# Altium schematic symbol library jlcpcb_2025_04_inductors_extended_0402.schlib: 1396 symbols (part 1 of 8) (continued)
## EBLS1005-2R2K
designator L?  Inductance: 2.2uH
Inductor, 2.2uH, ±10%, 1.7Ω, 10mA, SMD 0402; Manufacturer: HYHONGYEX; Manufacturer Part Number: EBLS1005-2R2K; Self-Resonant Frequency: 28MHz; Q Factor: 20@10MHz; Package Size: 0402; JLCPCB Basic Part: No; JLCPCB Part Number: C963788; Supplier 1: LCSC; Category: Inductors; Supplier Part Number 1: C963788; Tolerance: ±10%; Rated Current: 10mA; DC Resistance: 1.7Ω; RoHS: Yes; ComponentLink1Description: Datasheet; ComponentLink1URL: https://wmsc.lcsc.com/wmsc/upload/file/pdf/v2/lcsc/2205060945_HYHONGYEX-EBLS1005-2R2K_C963788.pdf; ComponentLink2Description: JLCPCB Part URL; ComponentLink2URL: https://jlcpcb.com/partdetail/C963788; ComponentLink3Description: LCSC Part URL; ComponentLink3URL: https://lcsc.com/product-detail/Inductors-SMD_HYHONGYEX-HYHONGYEX-EBLS1005-2R2K_C963788.html
footprint IND-0402 (0402 (1005M) Inductor)
pins: 1, 2

## FCI1005F-1R5K
designator L?  Inductance: 1.5uH
Inductor, 1.5uH, ±10%, 1.45Ω, 15mA, SMD 0402; Manufacturer: TAI-TECH; Manufacturer Part Number: FCI1005F-1R5K; Package Size: 0402; JLCPCB Basic Part: No; JLCPCB Part Number: C356917; Supplier 1: LCSC; Category: Inductors; Supplier Part Number 1: C356917; Tolerance: ±10%; Rated Current: 15mA; DC Resistance: 1.45Ω; RoHS: Yes; ComponentLink1Description: Datasheet; ComponentLink1URL: https://wmsc.lcsc.com/wmsc/upload/file/pdf/v2/lcsc/2009171137_TAI-TECH-FCI1005F-1R5K_C356917.pdf; ComponentLink2Description: JLCPCB Part URL; ComponentLink2URL: https://jlcpcb.com/partdetail/C356917; ComponentLink3Description: LCSC Part URL; ComponentLink3URL: https://lcsc.com/product-detail/Inductors-SMD_TAI-TECH-TAI-TECH-FCI1005F-1R5K_C356917.html
footprint IND-0402 (0402 (1005M) Inductor)
pins: 1, 2

## FCI1005F-2R2K
designator L?  Inductance: 2.2uH
Inductor, 2.2uH, ±10%, 1.7Ω, 10mA, SMD 0402; Manufacturer: TAI-TECH; Manufacturer Part Number: FCI1005F-2R2K; Package Size: 0402; JLCPCB Basic Part: No; JLCPCB Part Number: C154999; Supplier 1: LCSC; Category: Inductors; Supplier Part Number 1: C154999; Tolerance: ±10%; Rated Current: 10mA; DC Resistance: 1.7Ω; RoHS: Yes; ComponentLink1Description: Datasheet; ComponentLink1URL: https://wmsc.lcsc.com/wmsc/upload/file/pdf/v2/lcsc/2009171305_TAI-TECH-FCI1005F-2R2K_C154999.pdf; ComponentLink2Description: JLCPCB Part URL; ComponentLink2URL: https://jlcpcb.com/partdetail/C154999; ComponentLink3Description: LCSC Part URL; ComponentLink3URL: https://lcsc.com/product-detail/Inductors-SMD_TAI-TECH-TAI-TECH-FCI1005F-2R2K_C154999.html
footprint IND-0402 (0402 (1005M) Inductor)
pins: 1, 2

## FHW0402UC1N2KST
designator L?  Inductance: 1.2nH
Inductor, 1.2nH, ±10%, 135mΩ, 640mA, SMD 0402; Manufacturer: FH(Guangdong Fenghua Advanced Tech); Manufacturer Part Number: FHW0402UC1N2KST; Self-Resonant Frequency: 10GHz; Q Factor: 8@250MHz; Package Size: 0402; JLCPCB Basic Part: No; JLCPCB Part Number: C317662; Supplier 1: LCSC; Category: Inductors; Supplier Part Number 1: C317662; Tolerance: ±10%; Rated Current: 640mA; DC Resistance: 135mΩ; RoHS: Yes; ComponentLink1Description: Datasheet; ComponentLink1URL: https://wmsc.lcsc.com/wmsc/upload/file/pdf/v2/lcsc/2302231208_FH--Guangdong-Fenghua-Advanced-Tech-FHW0402UC1N2KST_C317662.pdf; ComponentLink2Description: JLCPCB Part URL; ComponentLink2URL: https://jlcpcb.com/partdetail/C317662; ComponentLink3Description: LCSC Part URL; ComponentLink3URL: https://lcsc.com/product-detail/Inductors-SMD_FH-Guangdong-Fenghua-Advanced-Tech-FH-Guangdong-Fenghua-Advanced-Tech-FHW0402UC1N2KST_C317662.html
footprint IND-0402 (0402 (1005M) Inductor)
pins: 1, 2

## FHW0402UC1N8KST
designator L?  Inductance: 1.8nH
Inductor, 1.8nH, ±10%, 70mΩ, 1.04A, SMD 0402; Manufacturer: FH(Guangdong Fenghua Advanced Tech); Manufacturer Part Number: FHW0402UC1N8KST; Self-Resonant Frequency: 6GHz; Q Factor: 16@250MHz; Package Size: 0402; JLCPCB Basic Part: No; JLCPCB Part Number: C317663; Supplier 1: LCSC; Category: Inductors; Supplier Part Number 1: C317663; Tolerance: ±10%; Rated Current: 1.04A; DC Resistance: 70mΩ; RoHS: Yes; ComponentLink1Description: Datasheet; ComponentLink1URL: https://wmsc.lcsc.com/wmsc/upload/file/pdf/v2/lcsc/2302231208_FH--Guangdong-Fenghua-Advanced-Tech-FHW0402UC1N8KST_C317663.pdf; ComponentLink2Description: JLCPCB Part URL; ComponentLink2URL: https://jlcpcb.com/partdetail/C317663; ComponentLink3Description: LCSC Part URL; ComponentLink3URL: https://lcsc.com/product-detail/Inductors-SMD_FH-Guangdong-Fenghua-Advanced-Tech-FH-Guangdong-Fenghua-Advanced-Tech-FHW0402UC1N8KST_C317663.html
footprint IND-0402 (0402 (1005M) Inductor)
pins: 1, 2

## FHW0402UC1N9KST
designator L?  Inductance: 1.9nH
Inductor, 1.9nH, ±10%, 70mΩ, 1.04A, SMD 0402; Manufacturer: FH(Guangdong Fenghua Advanced Tech); Manufacturer Part Number: FHW0402UC1N9KST; Self-Resonant Frequency: 6GHz; Q Factor: 16@250MHz; Package Size: 0402; JLCPCB Basic Part: No; JLCPCB Part Number: C317664; Supplier 1: LCSC; Category: Inductors; Supplier Part Number 1: C317664; Tolerance: ±10%; Rated Current: 1.04A; DC Resistance: 70mΩ; RoHS: Yes; ComponentLink1Description: Datasheet; ComponentLink1URL: https://wmsc.lcsc.com/wmsc/upload/file/pdf/v2/lcsc/2302231208_FH--Guangdong-Fenghua-Advanced-Tech-FHW0402UC1N9KST_C317664.pdf; ComponentLink2Description: JLCPCB Part URL; ComponentLink2URL: https://jlcpcb.com/partdetail/C317664; ComponentLink3Description: LCSC Part URL; ComponentLink3URL: https://lcsc.com/product-detail/Inductors-SMD_FH-Guangdong-Fenghua-Advanced-Tech-FH-Guangdong-Fenghua-Advanced-Tech-FHW0402UC1N9KST_C317664.html
footprint IND-0402 (0402 (1005M) Inductor)
pins: 1, 2

## FHW0402UC2N0KST
designator L?  Inductance: 2nH
Inductor, 2nH, ±10%, 70mΩ, 1.04A, SMD 0402; Manufacturer: FH(Guangdong Fenghua Advanced Tech); Manufacturer Part Number: FHW0402UC2N0KST; Self-Resonant Frequency: 6GHz; Q Factor: 18@250MHz; Package Size: 0402; JLCPCB Basic Part: No; JLCPCB Part Number: C317665; Supplier 1: LCSC; Category: Inductors; Supplier Part Number 1: C317665; Tolerance: ±10%; Rated Current: 1.04A; DC Resistance: 70mΩ; RoHS: Yes; ComponentLink1Description: Datasheet; ComponentLink1URL: https://wmsc.lcsc.com/wmsc/upload/file/pdf/v2/lcsc/2302231208_FH--Guangdong-Fenghua-Advanced-Tech-FHW0402UC2N0KST_C317665.pdf; ComponentLink2Description: JLCPCB Part URL; ComponentLink2URL: https://jlcpcb.com/partdetail/C317665; ComponentLink3Description: LCSC Part URL; ComponentLink3URL: https://lcsc.com/product-detail/Inductors-SMD_FH-Guangdong-Fenghua-Advanced-Tech-FH-Guangdong-Fenghua-Advanced-Tech-FHW0402UC2N0KST_C317665.html
footprint IND-0402 (0402 (1005M) Inductor)
pins: 1, 2

## FHW0402UC2N2KST
designator L?  Inductance: 2.2nH
Inductor, 2.2nH, ±10%, 70mΩ, 960mA, SMD 0402; Manufacturer: FH(Guangdong Fenghua Advanced Tech); Manufacturer Part Number: FHW0402UC2N2KST; Self-Resonant Frequency: 6GHz; Q Factor: 18@250MHz; Package Size: 0402; JLCPCB Basic Part: No; JLCPCB Part Number: C317666; Supplier 1: LCSC; Category: Inductors; Supplier Part Number 1: C317666; Tolerance: ±10%; Rated Current: 960mA; DC Resistance: 70mΩ; RoHS: Yes; ComponentLink1Description: Datasheet; ComponentLink1URL: https://wmsc.lcsc.com/wmsc/upload/file/pdf/v2/lcsc/2302231208_FH--Guangdong-Fenghua-Advanced-Tech-FHW0402UC2N2KST_C317666.pdf; ComponentLink2Description: JLCPCB Part URL; ComponentLink2URL: https://jlcpcb.com/partdetail/C317666; ComponentLink3Description: LCSC Part URL; ComponentLink3URL: https://lcsc.com/product-detail/Inductors-SMD_FH-Guangdong-Fenghua-Advanced-Tech-FH-Guangdong-Fenghua-Advanced-Tech-FHW0402UC2N2KST_C317666.html
footprint IND-0402 (0402 (1005M) Inductor)
pins: 1, 2

## FHW0402UC2N5KST
designator L?  Inductance: 2.5nH
Inductor, 2.5nH, ±10%, 120mΩ, 640mA, SMD 0402; Manufacturer: FH(Guangdong Fenghua Advanced Tech); Manufacturer Part Number: FHW0402UC2N5KST; Self-Resonant Frequency: 6GHz; Q Factor: 15@250MHz; Package Size: 0402; JLCPCB Basic Part: No; JLCPCB Part Number: C317668; Supplier 1: LCSC; Category: Inductors; Supplier Part Number 1: C317668; Tolerance: ±10%; Rated Current: 640mA; DC Resistance: 120mΩ; RoHS: Yes; ComponentLink1Description: Datasheet; ComponentLink1URL: https://wmsc.lcsc.com/wmsc/upload/file/pdf/v2/lcsc/2302231208_FH--Guangdong-Fenghua-Advanced-Tech-FHW0402UC2N5KST_C317668.pdf; ComponentLink2Description: JLCPCB Part URL; ComponentLink2URL: https://jlcpcb.com/partdetail/C317668; ComponentLink3Description: LCSC Part URL; ComponentLink3URL: https://lcsc.com/product-detail/Inductors-SMD_FH-Guangdong-Fenghua-Advanced-Tech-FH-Guangdong-Fenghua-Advanced-Tech-FHW0402UC2N5KST_C317668.html
footprint IND-0402 (0402 (1005M) Inductor)
pins: 1, 2

## FHW0402UC2N7KST
designator L?  Inductance: 2.7nH
Inductor, 2.7nH, ±10%, 120mΩ, 640mA, SMD 0402; Manufacturer: FH(Guangdong Fenghua Advanced Tech); Manufacturer Part Number: FHW0402UC2N7KST; Self-Resonant Frequency: 6GHz; Q Factor: 15@250MHz; Package Size: 0402; JLCPCB Basic Part: No; JLCPCB Part Number: C317935; Supplier 1: LCSC; Category: Inductors; Supplier Part Number 1: C317935; Tolerance: ±10%; Rated Current: 640mA; DC Resistance: 120mΩ; RoHS: Yes; ComponentLink1Description: Datasheet; ComponentLink1URL: https://wmsc.lcsc.com/wmsc/upload/file/pdf/v2/lcsc/2302231208_FH--Guangdong-Fenghua-Advanced-Tech-FHW0402UC2N7KST_C317935.pdf; ComponentLink2Description: JLCPCB Part URL; ComponentLink2URL: https://jlcpcb.com/partdetail/C317935; ComponentLink3Description: LCSC Part URL; ComponentLink3URL: https://lcsc.com/product-detail/Inductors-SMD_FH-Guangdong-Fenghua-Advanced-Tech-FH-Guangdong-Fenghua-Advanced-Tech-FHW0402UC2N7KST_C317935.html
footprint IND-0402 (0402 (1005M) Inductor)
pins: 1, 2

## FHW0402UC2N9KST
designator L?  Inductance: 2.9nH
Inductor, 2.9nH, ±10%, 300mΩ, 400mA, SMD 0402; Manufacturer: FH(Guangdong Fenghua Advanced Tech); Manufacturer Part Number: FHW0402UC2N9KST; Self-Resonant Frequency: 6GHz; Q Factor: 8@250MHz; Package Size: 0402; JLCPCB Basic Part: No; JLCPCB Part Number: C317936; Supplier 1: LCSC; Category: Inductors; Supplier Part Number 1: C317936; Tolerance: ±10%; Rated Current: 400mA; DC Resistance: 300mΩ; RoHS: Yes; ComponentLink1Description: Datasheet; ComponentLink1URL: https://wmsc.lcsc.com/wmsc/upload/file/pdf/v2/lcsc/2302231208_FH--Guangdong-Fenghua-Advanced-Tech-FHW0402UC2N9KST_C317936.pdf; ComponentLink2Description: JLCPCB Part URL; ComponentLink2URL: https://jlcpcb.com/partdetail/C317936; ComponentLink3Description: LCSC Part URL; ComponentLink3URL: https://lcsc.com/product-detail/Inductors-SMD_FH-Guangdong-Fenghua-Advanced-Tech-FH-Guangdong-Fenghua-Advanced-Tech-FHW0402UC2N9KST_C317936.html
footprint IND-0402 (0402 (1005M) Inductor)
pins: 1, 2

## FHW0402UC3N3JST
designator L?  Inductance: 3.3nH
Inductor, 3.3nH, ±5%, 66mΩ, 840mA, SMD 0402; Manufacturer: FH(Guangdong Fenghua Advanced Tech); Manufacturer Part Number: FHW0402UC3N3JST; Self-Resonant Frequency: 6GHz; Q Factor: 20@250MHz; Package Size: 0402; JLCPCB Basic Part: No; JLCPCB Part Number: C317937; Supplier 1: LCSC; Category: Inductors; Supplier Part Number 1: C317937; Tolerance: ±5%; Rated Current: 840mA; DC Resistance: 66mΩ; RoHS: Yes; ComponentLink1Description: Datasheet; ComponentLink1URL: https://wmsc.lcsc.com/wmsc/upload/file/pdf/v2/lcsc/2302231208_FH--Guangdong-Fenghua-Advanced-Tech-FHW0402UC3N3JST_C317937.pdf; ComponentLink2Description: JLCPCB Part URL; ComponentLink2URL: https://jlcpcb.com/partdetail/C317937; ComponentLink3Description: LCSC Part URL; ComponentLink3URL: https://lcsc.com/product-detail/Inductors-SMD_FH-Guangdong-Fenghua-Advanced-Tech-FH-Guangdong-Fenghua-Advanced-Tech-FHW0402UC3N3JST_C317937.html
footprint IND-0402 (0402 (1005M) Inductor)
pins: 1, 2

## FHW0402UC3N9JST
designator L?  Inductance: 3.9nH
Inductor, 3.9nH, ±5%, 66mΩ, 840mA, SMD 0402; Manufacturer: FH(Guangdong Fenghua Advanced Tech); Manufacturer Part Number: FHW0402UC3N9JST; Self-Resonant Frequency: 6GHz; Q Factor: 20@250MHz; Package Size: 0402; JLCPCB Basic Part: No; JLCPCB Part Number: C317939; Supplier 1: LCSC; Category: Inductors; Supplier Part Number 1: C317939; Tolerance: ±5%; Rated Current: 840mA; DC Resistance: 66mΩ; RoHS: Yes; ComponentLink1Description: Datasheet; ComponentLink1URL: https://wmsc.lcsc.com/wmsc/upload/file/pdf/v2/lcsc/2302231208_FH--Guangdong-Fenghua-Advanced-Tech-FHW0402UC3N9JST_C317939.pdf; ComponentLink2Description: JLCPCB Part URL; ComponentLink2URL: https://jlcpcb.com/partdetail/C317939; ComponentLink3Description: LCSC Part URL; ComponentLink3URL: https://lcsc.com/product-detail/Inductors-SMD_FH-Guangdong-Fenghua-Advanced-Tech-FH-Guangdong-Fenghua-Advanced-Tech-FHW0402UC3N9JST_C317939.html
footprint IND-0402 (0402 (1005M) Inductor)
pins: 1, 2

## FHW0402UC4N3JST
designator L?  Inductance: 4.3nH
Inductor, 4.3nH, ±5%, 91mΩ, 700mA, SMD 0402; Manufacturer: FH(Guangdong Fenghua Advanced Tech); Manufacturer Part Number: FHW0402UC4N3JST; Self-Resonant Frequency: 6GHz; Q Factor: 20@250MHz; Package Size: 0402; JLCPCB Basic Part: No; JLCPCB Part Number: C317940; Supplier 1: LCSC; Category: Inductors; Supplier Part Number 1: C317940; Tolerance: ±5%; Rated Current: 700mA; DC Resistance: 91mΩ; RoHS: Yes; ComponentLink1Description: Datasheet; ComponentLink1URL: https://wmsc.lcsc.com/wmsc/upload/file/pdf/v2/lcsc/2302231208_FH--Guangdong-Fenghua-Advanced-Tech-FHW0402UC4N3JST_C317940.pdf; ComponentLink2Description: JLCPCB Part URL; ComponentLink2URL: https://jlcpcb.com/partdetail/C317940; ComponentLink3Description: LCSC Part URL; ComponentLink3URL: https://lcsc.com/product-detail/Inductors-SMD_FH-Guangdong-Fenghua-Advanced-Tech-FH-Guangdong-Fenghua-Advanced-Tech-FHW0402UC4N3JST_C317940.html
footprint IND-0402 (0402 (1005M) Inductor)
pins: 1, 2

## FHW0402UC4N7JST
designator L?  Inductance: 4.7nH
Inductor, 4.7nH, ±5%, 200mΩ, 640mA, SMD 0402; Manufacturer: FH(Guangdong Fenghua Advanced Tech); Manufacturer Part Number: FHW0402UC4N7JST; Self-Resonant Frequency: 4.5GHz; Q Factor: 18@250MHz; Package Size: 0402; JLCPCB Basic Part: No; JLCPCB Part Number: C317941; Supplier 1: LCSC; Category: Inductors; Supplier Part Number 1: C317941; Tolerance: ±5%; Rated Current: 640mA; DC Resistance: 200mΩ; RoHS: Yes; ComponentLink1Description: Datasheet; ComponentLink1URL: https://wmsc.lcsc.com/wmsc/upload/file/pdf/v2/lcsc/2302231208_FH--Guangdong-Fenghua-Advanced-Tech-FHW0402UC4N7JST_C317941.pdf; ComponentLink2Description: JLCPCB Part URL; ComponentLink2URL: https://jlcpcb.com/partdetail/C317941; ComponentLink3Description: LCSC Part URL; ComponentLink3URL: https://lcsc.com/product-detail/Inductors-SMD_FH-Guangdong-Fenghua-Advanced-Tech-FH-Guangdong-Fenghua-Advanced-Tech-FHW0402UC4N7JST_C317941.html
footprint IND-0402 (0402 (1005M) Inductor)
pins: 1, 2

## FHW0402UC5N1JST
designator L?  Inductance: 5.1nH
Inductor, 5.1nH, ±5%, 83mΩ, 800mA, SMD 0402; Manufacturer: FH(Guangdong Fenghua Advanced Tech); Manufacturer Part Number: FHW0402UC5N1JST; Self-Resonant Frequency: 4.8GHz; Q Factor: 18@250MHz; Package Size: 0402; JLCPCB Basic Part: No; JLCPCB Part Number: C317942; Supplier 1: LCSC; Category: Inductors; Supplier Part Number 1: C317942; Tolerance: ±5%; Rated Current: 800mA; DC Resistance: 83mΩ; RoHS: Yes; ComponentLink1Description: Datasheet; ComponentLink1URL: https://wmsc.lcsc.com/wmsc/upload/file/pdf/v2/lcsc/2302231208_FH--Guangdong-Fenghua-Advanced-Tech-FHW0402UC5N1JST_C317942.pdf; ComponentLink2Description: JLCPCB Part URL; ComponentLink2URL: https://jlcpcb.com/partdetail/C317942; ComponentLink3Description: LCSC Part URL; ComponentLink3URL: https://lcsc.com/product-detail/Inductors-SMD_FH-Guangdong-Fenghua-Advanced-Tech-FH-Guangdong-Fenghua-Advanced-Tech-FHW0402UC5N1JST_C317942.html
footprint IND-0402 (0402 (1005M) Inductor)
pins: 1, 2

## FHW0402UC5N6JST
designator L?  Inductance: 5.6nH
Inductor, 5.6nH, ±5%, 83mΩ, 760mA, SMD 0402; Manufacturer: FH(Guangdong Fenghua Advanced Tech); Manufacturer Part Number: FHW0402UC5N6JST; Self-Resonant Frequency: 4.8GHz; Q Factor: 20@250MHz; Package Size: 0402; JLCPCB Basic Part: No; JLCPCB Part Number: C317943; Supplier 1: LCSC; Category: Inductors; Supplier Part Number 1: C317943; Tolerance: ±5%; Rated Current: 760mA; DC Resistance: 83mΩ; RoHS: Yes; ComponentLink1Description: Datasheet; ComponentLink1URL: https://wmsc.lcsc.com/wmsc/upload/file/pdf/v2/lcsc/2302231208_FH--Guangdong-Fenghua-Advanced-Tech-FHW0402UC5N6JST_C317943.pdf; ComponentLink2Description: JLCPCB Part URL; ComponentLink2URL: https://jlcpcb.com/partdetail/C317943; ComponentLink3Description: LCSC Part URL; ComponentLink3URL: https://lcsc.com/product-detail/Inductors-SMD_FH-Guangdong-Fenghua-Advanced-Tech-FH-Guangdong-Fenghua-Advanced-Tech-FHW0402UC5N6JST_C317943.html
footprint IND-0402 (0402 (1005M) Inductor)
pins: 1, 2

## FHW0402UC6N2JST
designator L?  Inductance: 6.2nH
Inductor, 6.2nH, ±5%, 83mΩ, 760mA, SMD 0402; Manufacturer: FH(Guangdong Fenghua Advanced Tech); Manufacturer Part Number: FHW0402UC6N2JST; Self-Resonant Frequency: 4.8GHz; Q Factor: 23@250MHz; Package Size: 0402; JLCPCB Basic Part: No; JLCPCB Part Number: C304265; Supplier 1: LCSC; Category: Inductors; Supplier Part Number 1: C304265; Tolerance: ±5%; Rated Current: 760mA; DC Resistance: 83mΩ; RoHS: Yes; ComponentLink1Description: Datasheet; ComponentLink1URL: https://wmsc.lcsc.com/wmsc/upload/file/pdf/v2/lcsc/2302231030_FH--Guangdong-Fenghua-Advanced-Tech-FHW0402UC6N2JST_C304265.pdf; ComponentLink2Description: JLCPCB Part URL; ComponentLink2URL: https://jlcpcb.com/partdetail/C304265; ComponentLink3Description: LCSC Part URL; ComponentLink3URL: https://lcsc.com/product-detail/Inductors-SMD_FH-Guangdong-Fenghua-Advanced-Tech-FH-Guangdong-Fenghua-Advanced-Tech-FHW0402UC6N2JST_C304265.html
footprint IND-0402 (0402 (1005M) Inductor)
pins: 1, 2

## FHW0402UC6N8JST
designator L?  Inductance: 6.8nH
Inductor, 6.8nH, ±5%, 260mΩ, 680mA, SMD 0402; Manufacturer: FH(Guangdong Fenghua Advanced Tech); Manufacturer Part Number: FHW0402UC6N8JST; Self-Resonant Frequency: 4.8GHz; Q Factor: 23@250MHz; Package Size: 0402; JLCPCB Basic Part: No; JLCPCB Part Number: C317944; Supplier 1: LCSC; Category: Inductors; Supplier Part Number 1: C317944; Tolerance: ±5%; Rated Current: 680mA; DC Resistance: 260mΩ; RoHS: Yes; ComponentLink1Description: Datasheet; ComponentLink1URL: https://wmsc.lcsc.com/wmsc/upload/file/pdf/v2/lcsc/2302231208_FH--Guangdong-Fenghua-Advanced-Tech-FHW0402UC6N8JST_C317944.pdf; ComponentLink2Description: JLCPCB Part URL; ComponentLink2URL: https://jlcpcb.com/partdetail/C317944; ComponentLink3Description: LCSC Part URL; ComponentLink3URL: https://lcsc.com/product-detail/Inductors-SMD_FH-Guangdong-Fenghua-Advanced-Tech-FH-Guangdong-Fenghua-Advanced-Tech-FHW0402UC6N8JST_C317944.html
footprint IND-0402 (0402 (1005M) Inductor)
pins: 1, 2

## FHW0402UC7N5JST
designator L?  Inductance: 7.5nH
Inductor, 7.5nH, ±5%, 100mΩ, 680mA, SMD 0402; Manufacturer: FH(Guangdong Fenghua Advanced Tech); Manufacturer Part Number: FHW0402UC7N5JST; Self-Resonant Frequency: 4.8GHz; Q Factor: 23@250MHz; Package Size: 0402; JLCPCB Basic Part: No; JLCPCB Part Number: C317945; Supplier 1: LCSC; Category: Inductors; Supplier Part Number 1: C317945; Tolerance: ±5%; Rated Current: 680mA; DC Resistance: 100mΩ; RoHS: Yes; ComponentLink1Description: Datasheet; ComponentLink1URL: https://wmsc.lcsc.com/wmsc/upload/file/pdf/v2/lcsc/2302231208_FH--Guangdong-Fenghua-Advanced-Tech-FHW0402UC7N5JST_C317945.pdf; ComponentLink2Description: JLCPCB Part URL; ComponentLink2URL: https://jlcpcb.com/partdetail/C317945; ComponentLink3Description: LCSC Part URL; ComponentLink3URL: https://lcsc.com/product-detail/Inductors-SMD_FH-Guangdong-Fenghua-Advanced-Tech-FH-Guangdong-Fenghua-Advanced-Tech-FHW0402UC7N5JST_C317945.html
footprint IND-0402 (0402 (1005M) Inductor)
pins: 1, 2

## FHW0402UC8N2JST
designator L?  Inductance: 8.2nH
Inductor, 8.2nH, ±5%, 100mΩ, 680mA, SMD 0402; Manufacturer: FH(Guangdong Fenghua Advanced Tech); Manufacturer Part Number: FHW0402UC8N2JST; Self-Resonant Frequency: 4.4GHz; Q Factor: 25@250MHz; Package Size: 0402; JLCPCB Basic Part: No; JLCPCB Part Number: C317946; Supplier 1: LCSC; Category: Inductors; Supplier Part Number 1: C317946; Tolerance: ±5%; Rated Current: 680mA; DC Resistance: 100mΩ; RoHS: Yes; ComponentLink1Description: Datasheet; ComponentLink1URL: https://wmsc.lcsc.com/wmsc/upload/file/pdf/v2/lcsc/2302231208_FH--Guangdong-Fenghua-Advanced-Tech-FHW0402UC8N2JST_C317946.pdf; ComponentLink2Description: JLCPCB Part URL; ComponentLink2URL: https://jlcpcb.com/partdetail/C317946; ComponentLink3Description: LCSC Part URL; ComponentLink3URL: https://lcsc.com/product-detail/Inductors-SMD_FH-Guangdong-Fenghua-Advanced-Tech-FH-Guangdong-Fenghua-Advanced-Tech-FHW0402UC8N2JST_C317946.html
footprint IND-0402 (0402 (1005M) Inductor)
pins: 1, 2

## FHW0402UC8N7JST
designator L?  Inductance: 8.7nH
Inductor, 8.7nH, ±5%, 200mΩ, 480mA, SMD 0402; Manufacturer: FH(Guangdong Fenghua Advanced Tech); Manufacturer Part Number: FHW0402UC8N7JST; Self-Resonant Frequency: 4.1GHz; Q Factor: 25@250MHz; Package Size: 0402; JLCPCB Basic Part: No; JLCPCB Part Number: C317947; Supplier 1: LCSC; Category: Inductors; Supplier Part Number 1: C317947; Tolerance: ±5%; Rated Current: 480mA; DC Resistance: 200mΩ; RoHS: Yes; ComponentLink1Description: Datasheet; ComponentLink1URL: https://wmsc.lcsc.com/wmsc/upload/file/pdf/v2/lcsc/2302231208_FH--Guangdong-Fenghua-Advanced-Tech-FHW0402UC8N7JST_C317947.pdf; ComponentLink2Description: JLCPCB Part URL; ComponentLink2URL: https://jlcpcb.com/partdetail/C317947; ComponentLink3Description: LCSC Part URL; ComponentLink3URL: https://lcsc.com/product-detail/Inductors-SMD_FH-Guangdong-Fenghua-Advanced-Tech-FH-Guangdong-Fenghua-Advanced-Tech-FHW0402UC8N7JST_C317947.html
footprint IND-0402 (0402 (1005M) Inductor)
pins: 1, 2

## FHW0402UC9N0JST
designator L?  Inductance: 9nH
Inductor, 9nH, ±5%, 100mΩ, 680mA, SMD 0402; Manufacturer: FH(Guangdong Fenghua Advanced Tech); Manufacturer Part Number: FHW0402UC9N0JST; Self-Resonant Frequency: 4.16GHz; Q Factor: 25@250MHz; Package Size: 0402; JLCPCB Basic Part: No; JLCPCB Part Number: C317948; Supplier 1: LCSC; Category: Inductors; Supplier Part Number 1: C317948; Tolerance: ±5%; Rated Current: 680mA; DC Resistance: 100mΩ; RoHS: Yes; ComponentLink1Description: Datasheet; ComponentLink1URL: https://wmsc.lcsc.com/wmsc/upload/file/pdf/v2/lcsc/2302231208_FH--Guangdong-Fenghua-Advanced-Tech-FHW0402UC9N0JST_C317948.pdf; ComponentLink2Description: JLCPCB Part URL; ComponentLink2URL: https://jlcpcb.com/partdetail/C317948; ComponentLink3Description: LCSC Part URL; ComponentLink3URL: https://lcsc.com/product-detail/Inductors-SMD_FH-Guangdong-Fenghua-Advanced-Tech-FH-Guangdong-Fenghua-Advanced-Tech-FHW0402UC9N0JST_C317948.html
footprint IND-0402 (0402 (1005M) Inductor)
pins: 1, 2

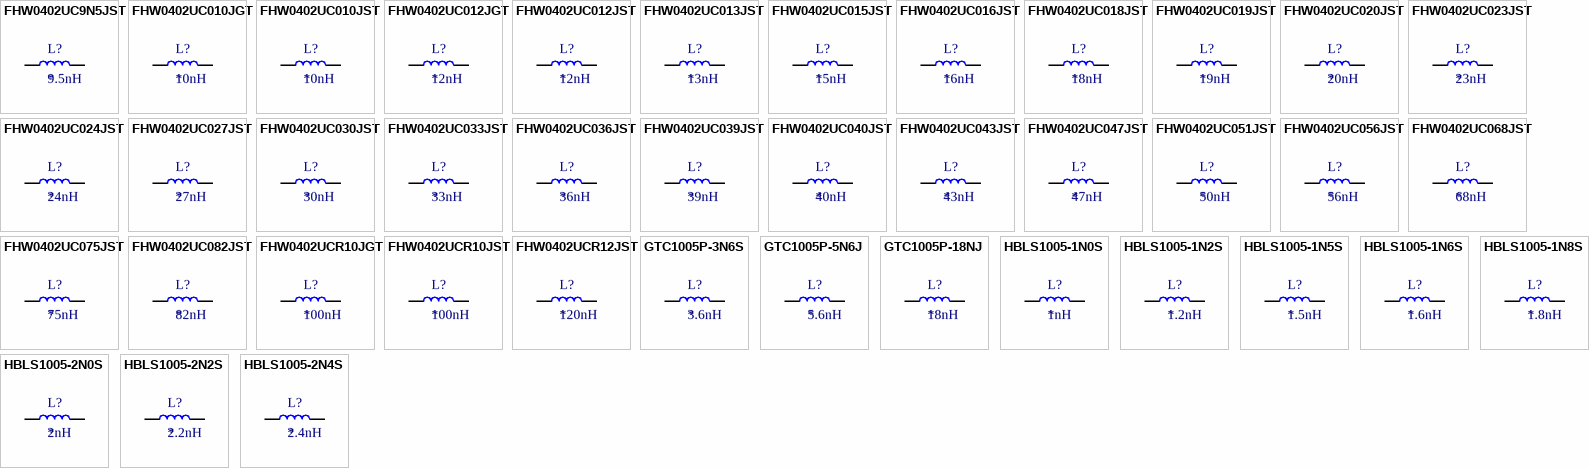
[diagram p4: symbols FHW0402UC9N5JST to HBLS1005-2N4S]

## FHW0402UC9N5JST
designator L?  Inductance: 9.5nH
Inductor, 9.5nH, ±5%, 200mΩ, 480mA, SMD 0402; Manufacturer: FH(Guangdong Fenghua Advanced Tech); Manufacturer Part Number: FHW0402UC9N5JST; Self-Resonant Frequency: 4GHz; Q Factor: 25@250MHz; Package Size: 0402; JLCPCB Basic Part: No; JLCPCB Part Number: C317949; Supplier 1: LCSC; Category: Inductors; Supplier Part Number 1: C317949; Tolerance: ±5%; Rated Current: 480mA; DC Resistance: 200mΩ; RoHS: Yes; ComponentLink1Description: Datasheet; ComponentLink1URL: https://wmsc.lcsc.com/wmsc/upload/file/pdf/v2/lcsc/2302231208_FH--Guangdong-Fenghua-Advanced-Tech-FHW0402UC9N5JST_C317949.pdf; ComponentLink2Description: JLCPCB Part URL; ComponentLink2URL: https://jlcpcb.com/partdetail/C317949; ComponentLink3Description: LCSC Part URL; ComponentLink3URL: https://lcsc.com/product-detail/Inductors-SMD_FH-Guangdong-Fenghua-Advanced-Tech-FH-Guangdong-Fenghua-Advanced-Tech-FHW0402UC9N5JST_C317949.html
footprint IND-0402 (0402 (1005M) Inductor)
pins: 1, 2

## FHW0402UC010JGT
designator L?  Inductance: 10nH
Inductor, 10nH, ±5%, 200mΩ, 480mA, SMD 0402; Manufacturer: FH(Guangdong Fenghua Advanced Tech); Manufacturer Part Number: FHW0402UC010JGT; Self-Resonant Frequency: 3.9GHz; Q Factor: 25@250MHz; Package Size: 0402; JLCPCB Basic Part: No; JLCPCB Part Number: C316442; Supplier 1: LCSC; Category: Inductors; Supplier Part Number 1: C316442; Tolerance: ±5%; Rated Current: 480mA; DC Resistance: 200mΩ; RoHS: Yes; ComponentLink1Description: Datasheet; ComponentLink1URL: https://wmsc.lcsc.com/wmsc/upload/file/pdf/v2/lcsc/2110111630_FH--Guangdong-Fenghua-Advanced-Tech-FHW0402UC010JGT_C316442.pdf; ComponentLink2Description: JLCPCB Part URL; ComponentLink2URL: https://jlcpcb.com/partdetail/C316442; ComponentLink3Description: LCSC Part URL; ComponentLink3URL: https://lcsc.com/product-detail/Inductors-SMD_FH-Guangdong-Fenghua-Advanced-Tech-FH-Guangdong-Fenghua-Advanced-Tech-FHW0402UC010JGT_C316442.html
footprint IND-0402 (0402 (1005M) Inductor)
pins: 1, 2

## FHW0402UC010JST
designator L?  Inductance: 10nH
Inductor, 10nH, ±5%, 200mΩ, 480mA, SMD 0402; Manufacturer: FH(Guangdong Fenghua Advanced Tech); Manufacturer Part Number: FHW0402UC010JST; Self-Resonant Frequency: 3.9GHz; Q Factor: 25@250MHz; Package Size: 0402; JLCPCB Basic Part: No; JLCPCB Part Number: C317950; Supplier 1: LCSC; Category: Inductors; Supplier Part Number 1: C317950; Tolerance: ±5%; Rated Current: 480mA; DC Resistance: 200mΩ; RoHS: Yes; ComponentLink1Description: Datasheet; ComponentLink1URL: https://wmsc.lcsc.com/wmsc/upload/file/pdf/v2/lcsc/2302231208_FH--Guangdong-Fenghua-Advanced-Tech-FHW0402UC010JST_C317950.pdf; ComponentLink2Description: JLCPCB Part URL; ComponentLink2URL: https://jlcpcb.com/partdetail/C317950; ComponentLink3Description: LCSC Part URL; ComponentLink3URL: https://lcsc.com/product-detail/Inductors-SMD_FH-Guangdong-Fenghua-Advanced-Tech-FH-Guangdong-Fenghua-Advanced-Tech-FHW0402UC010JST_C317950.html
footprint IND-0402 (0402 (1005M) Inductor)
pins: 1, 2

## FHW0402UC012JGT
designator L?  Inductance: 12nH
Inductor, 12nH, ±5%, 120mΩ, 640mA, SMD 0402; Manufacturer: FH(Guangdong Fenghua Advanced Tech); Manufacturer Part Number: FHW0402UC012JGT; Self-Resonant Frequency: 3.6GHz; Q Factor: 25@250MHz; Package Size: 0402; JLCPCB Basic Part: No; JLCPCB Part Number: C316441; Supplier 1: LCSC; Category: Inductors; Supplier Part Number 1: C316441; Tolerance: ±5%; Rated Current: 640mA; DC Resistance: 120mΩ; RoHS: Yes; ComponentLink1Description: Datasheet; ComponentLink1URL: https://wmsc.lcsc.com/wmsc/upload/file/pdf/v2/lcsc/2110111630_FH--Guangdong-Fenghua-Advanced-Tech-FHW0402UC012JGT_C316441.pdf; ComponentLink2Description: JLCPCB Part URL; ComponentLink2URL: https://jlcpcb.com/partdetail/C316441; ComponentLink3Description: LCSC Part URL; ComponentLink3URL: https://lcsc.com/product-detail/Inductors-SMD_FH-Guangdong-Fenghua-Advanced-Tech-FH-Guangdong-Fenghua-Advanced-Tech-FHW0402UC012JGT_C316441.html
footprint IND-0402 (0402 (1005M) Inductor)
pins: 1, 2

## FHW0402UC012JST
designator L?  Inductance: 12nH
Inductor, 12nH, ±5%, 120mΩ, 640mA, SMD 0402; Manufacturer: FH(Guangdong Fenghua Advanced Tech); Manufacturer Part Number: FHW0402UC012JST; Self-Resonant Frequency: 3.6GHz; Q Factor: 25@250MHz; Package Size: 0402; JLCPCB Basic Part: No; JLCPCB Part Number: C317952; Supplier 1: LCSC; Category: Inductors; Supplier Part Number 1: C317952; Tolerance: ±5%; Rated Current: 640mA; DC Resistance: 120mΩ; RoHS: Yes; ComponentLink1Description: Datasheet; ComponentLink1URL: https://wmsc.lcsc.com/wmsc/upload/file/pdf/v2/lcsc/2302231208_FH--Guangdong-Fenghua-Advanced-Tech-FHW0402UC012JST_C317952.pdf; ComponentLink2Description: JLCPCB Part URL; ComponentLink2URL: https://jlcpcb.com/partdetail/C317952; ComponentLink3Description: LCSC Part URL; ComponentLink3URL: https://lcsc.com/product-detail/Inductors-SMD_FH-Guangdong-Fenghua-Advanced-Tech-FH-Guangdong-Fenghua-Advanced-Tech-FHW0402UC012JST_C317952.html
footprint IND-0402 (0402 (1005M) Inductor)
pins: 1, 2

## FHW0402UC013JST
designator L?  Inductance: 13nH
Inductor, 13nH, ±5%, 210mΩ, 440mA, SMD 0402; Manufacturer: FH(Guangdong Fenghua Advanced Tech); Manufacturer Part Number: FHW0402UC013JST; Self-Resonant Frequency: 3.45GHz; Q Factor: 25@250MHz; Package Size: 0402; JLCPCB Basic Part: No; JLCPCB Part Number: C317953; Supplier 1: LCSC; Category: Inductors; Supplier Part Number 1: C317953; Tolerance: ±5%; Rated Current: 440mA; DC Resistance: 210mΩ; RoHS: Yes; ComponentLink1Description: Datasheet; ComponentLink1URL: https://wmsc.lcsc.com/wmsc/upload/file/pdf/v2/lcsc/2302231208_FH--Guangdong-Fenghua-Advanced-Tech-FHW0402UC013JST_C317953.pdf; ComponentLink2Description: JLCPCB Part URL; ComponentLink2URL: https://jlcpcb.com/partdetail/C317953; ComponentLink3Description: LCSC Part URL; ComponentLink3URL: https://lcsc.com/product-detail/Inductors-SMD_FH-Guangdong-Fenghua-Advanced-Tech-FH-Guangdong-Fenghua-Advanced-Tech-FHW0402UC013JST_C317953.html
footprint IND-0402 (0402 (1005M) Inductor)
pins: 1, 2

## FHW0402UC015JST
designator L?  Inductance: 15nH
Inductor, 15nH, ±5%, 300mΩ, 560mA, SMD 0402; Manufacturer: FH(Guangdong Fenghua Advanced Tech); Manufacturer Part Number: FHW0402UC015JST; Self-Resonant Frequency: 3.28GHz; Q Factor: 25@250MHz; Package Size: 0402; JLCPCB Basic Part: No; JLCPCB Part Number: C317954; Supplier 1: LCSC; Category: Inductors; Supplier Part Number 1: C317954; Tolerance: ±5%; Rated Current: 560mA; DC Resistance: 300mΩ; RoHS: Yes; ComponentLink1Description: Datasheet; ComponentLink1URL: https://wmsc.lcsc.com/wmsc/upload/file/pdf/v2/lcsc/2302231208_FH--Guangdong-Fenghua-Advanced-Tech-FHW0402UC015JST_C317954.pdf; ComponentLink2Description: JLCPCB Part URL; ComponentLink2URL: https://jlcpcb.com/partdetail/C317954; ComponentLink3Description: LCSC Part URL; ComponentLink3URL: https://lcsc.com/product-detail/Inductors-SMD_FH-Guangdong-Fenghua-Advanced-Tech-FH-Guangdong-Fenghua-Advanced-Tech-FHW0402UC015JST_C317954.html
footprint IND-0402 (0402 (1005M) Inductor)
pins: 1, 2

## FHW0402UC016JST
designator L?  Inductance: 16nH
Inductor, 16nH, ±5%, 220mΩ, 560mA, SMD 0402; Manufacturer: FH(Guangdong Fenghua Advanced Tech); Manufacturer Part Number: FHW0402UC016JST; Self-Resonant Frequency: 3.1GHz; Q Factor: 25@250MHz; Package Size: 0402; JLCPCB Basic Part: No; JLCPCB Part Number: C317955; Supplier 1: LCSC; Category: Inductors; Supplier Part Number 1: C317955; Tolerance: ±5%; Rated Current: 560mA; DC Resistance: 220mΩ; RoHS: Yes; ComponentLink1Description: Datasheet; ComponentLink1URL: https://wmsc.lcsc.com/wmsc/upload/file/pdf/v2/lcsc/2302231208_FH--Guangdong-Fenghua-Advanced-Tech-FHW0402UC016JST_C317955.pdf; ComponentLink2Description: JLCPCB Part URL; ComponentLink2URL: https://jlcpcb.com/partdetail/C317955; ComponentLink3Description: LCSC Part URL; ComponentLink3URL: https://lcsc.com/product-detail/Inductors-SMD_FH-Guangdong-Fenghua-Advanced-Tech-FH-Guangdong-Fenghua-Advanced-Tech-FHW0402UC016JST_C317955.html
footprint IND-0402 (0402 (1005M) Inductor)
pins: 1, 2

## FHW0402UC018JST
designator L?  Inductance: 18nH
Inductor, 18nH, ±5%, 230mΩ, 420mA, SMD 0402; Manufacturer: FH(Guangdong Fenghua Advanced Tech); Manufacturer Part Number: FHW0402UC018JST; Self-Resonant Frequency: 3.1GHz; Q Factor: 25@250MHz; Package Size: 0402; JLCPCB Basic Part: No; JLCPCB Part Number: C317956; Supplier 1: LCSC; Category: Inductors; Supplier Part Number 1: C317956; Tolerance: ±5%; Rated Current: 420mA; DC Resistance: 230mΩ; RoHS: Yes; ComponentLink1Description: Datasheet; ComponentLink1URL: https://wmsc.lcsc.com/wmsc/upload/file/pdf/v2/lcsc/2302231208_FH--Guangdong-Fenghua-Advanced-Tech-FHW0402UC018JST_C317956.pdf; ComponentLink2Description: JLCPCB Part URL; ComponentLink2URL: https://jlcpcb.com/partdetail/C317956; ComponentLink3Description: LCSC Part URL; ComponentLink3URL: https://lcsc.com/product-detail/Inductors-SMD_FH-Guangdong-Fenghua-Advanced-Tech-FH-Guangdong-Fenghua-Advanced-Tech-FHW0402UC018JST_C317956.html
footprint IND-0402 (0402 (1005M) Inductor)
pins: 1, 2

## FHW0402UC019JST
designator L?  Inductance: 19nH
Inductor, 19nH, ±5%, 200mΩ, 480mA, SMD 0402; Manufacturer: FH(Guangdong Fenghua Advanced Tech); Manufacturer Part Number: FHW0402UC019JST; Self-Resonant Frequency: 3.04GHz; Q Factor: 25@250MHz; Package Size: 0402; JLCPCB Basic Part: No; JLCPCB Part Number: C317957; Supplier 1: LCSC; Category: Inductors; Supplier Part Number 1: C317957; Tolerance: ±5%; Rated Current: 480mA; DC Resistance: 200mΩ; RoHS: Yes; ComponentLink1Description: Datasheet; ComponentLink1URL: https://wmsc.lcsc.com/wmsc/upload/file/pdf/v2/lcsc/2302231208_FH--Guangdong-Fenghua-Advanced-Tech-FHW0402UC019JST_C317957.pdf; ComponentLink2Description: JLCPCB Part URL; ComponentLink2URL: https://jlcpcb.com/partdetail/C317957; ComponentLink3Description: LCSC Part URL; ComponentLink3URL: https://lcsc.com/product-detail/Inductors-SMD_FH-Guangdong-Fenghua-Advanced-Tech-FH-Guangdong-Fenghua-Advanced-Tech-FHW0402UC019JST_C317957.html
footprint IND-0402 (0402 (1005M) Inductor)
pins: 1, 2

## FHW0402UC020JST
designator L?  Inductance: 20nH
Inductor, 20nH, ±5%, 250mΩ, 420mA, SMD 0402; Manufacturer: FH(Guangdong Fenghua Advanced Tech); Manufacturer Part Number: FHW0402UC020JST; Self-Resonant Frequency: 3GHz; Q Factor: 25@250MHz; Package Size: 0402; JLCPCB Basic Part: No; JLCPCB Part Number: C317958; Supplier 1: LCSC; Category: Inductors; Supplier Part Number 1: C317958; Tolerance: ±5%; Rated Current: 420mA; DC Resistance: 250mΩ; RoHS: Yes; ComponentLink1Description: Datasheet; ComponentLink1URL: https://wmsc.lcsc.com/wmsc/upload/file/pdf/v2/lcsc/2302231208_FH--Guangdong-Fenghua-Advanced-Tech-FHW0402UC020JST_C317958.pdf; ComponentLink2Description: JLCPCB Part URL; ComponentLink2URL: https://jlcpcb.com/partdetail/C317958; ComponentLink3Description: LCSC Part URL; ComponentLink3URL: https://lcsc.com/product-detail/Inductors-SMD_FH-Guangdong-Fenghua-Advanced-Tech-FH-Guangdong-Fenghua-Advanced-Tech-FHW0402UC020JST_C317958.html
footprint IND-0402 (0402 (1005M) Inductor)
pins: 1, 2

## FHW0402UC023JST
designator L?  Inductance: 23nH
Inductor, 23nH, ±5%, 380mΩ, 310mA, SMD 0402; Manufacturer: FH(Guangdong Fenghua Advanced Tech); Manufacturer Part Number: FHW0402UC023JST; Self-Resonant Frequency: 2.72GHz; Q Factor: 22@250MHz; Package Size: 0402; JLCPCB Basic Part: No; JLCPCB Part Number: C317960; Supplier 1: LCSC; Category: Inductors; Supplier Part Number 1: C317960; Tolerance: ±5%; Rated Current: 310mA; DC Resistance: 380mΩ; RoHS: Yes; ComponentLink1Description: Datasheet; ComponentLink1URL: https://wmsc.lcsc.com/wmsc/upload/file/pdf/v2/lcsc/2302231208_FH--Guangdong-Fenghua-Advanced-Tech-FHW0402UC023JST_C317960.pdf; ComponentLink2Description: JLCPCB Part URL; ComponentLink2URL: https://jlcpcb.com/partdetail/C317960; ComponentLink3Description: LCSC Part URL; ComponentLink3URL: https://lcsc.com/product-detail/Inductors-SMD_FH-Guangdong-Fenghua-Advanced-Tech-FH-Guangdong-Fenghua-Advanced-Tech-FHW0402UC023JST_C317960.html
footprint IND-0402 (0402 (1005M) Inductor)
pins: 1, 2

## FHW0402UC024JST
designator L?  Inductance: 24nH
Inductor, 24nH, ±5%, 300mΩ, 400mA, SMD 0402; Manufacturer: FH(Guangdong Fenghua Advanced Tech); Manufacturer Part Number: FHW0402UC024JST; Self-Resonant Frequency: 2.7GHz; Q Factor: 25@250MHz; Package Size: 0402; JLCPCB Basic Part: No; JLCPCB Part Number: C317961; Supplier 1: LCSC; Category: Inductors; Supplier Part Number 1: C317961; Tolerance: ±5%; Rated Current: 400mA; DC Resistance: 300mΩ; RoHS: Yes; ComponentLink1Description: Datasheet; ComponentLink1URL: https://wmsc.lcsc.com/wmsc/upload/file/pdf/v2/lcsc/2302231208_FH--Guangdong-Fenghua-Advanced-Tech-FHW0402UC024JST_C317961.pdf; ComponentLink2Description: JLCPCB Part URL; ComponentLink2URL: https://jlcpcb.com/partdetail/C317961; ComponentLink3Description: LCSC Part URL; ComponentLink3URL: https://lcsc.com/product-detail/Inductors-SMD_FH-Guangdong-Fenghua-Advanced-Tech-FH-Guangdong-Fenghua-Advanced-Tech-FHW0402UC024JST_C317961.html
footprint IND-0402 (0402 (1005M) Inductor)
pins: 1, 2

## FHW0402UC027JST
designator L?  Inductance: 27nH
Inductor, 27nH, ±5%, 520mΩ, 280mA, SMD 0402; Manufacturer: FH(Guangdong Fenghua Advanced Tech); Manufacturer Part Number: FHW0402UC027JST; Self-Resonant Frequency: 2.48GHz; Q Factor: 24@250MHz; Package Size: 0402; JLCPCB Basic Part: No; JLCPCB Part Number: C317962; Supplier 1: LCSC; Category: Inductors; Supplier Part Number 1: C317962; Tolerance: ±5%; Rated Current: 280mA; DC Resistance: 520mΩ; RoHS: Yes; ComponentLink1Description: Datasheet; ComponentLink1URL: https://wmsc.lcsc.com/wmsc/upload/file/pdf/v2/lcsc/2302231208_FH--Guangdong-Fenghua-Advanced-Tech-FHW0402UC027JST_C317962.pdf; ComponentLink2Description: JLCPCB Part URL; ComponentLink2URL: https://jlcpcb.com/partdetail/C317962; ComponentLink3Description: LCSC Part URL; ComponentLink3URL: https://lcsc.com/product-detail/Inductors-SMD_FH-Guangdong-Fenghua-Advanced-Tech-FH-Guangdong-Fenghua-Advanced-Tech-FHW0402UC027JST_C317962.html
footprint IND-0402 (0402 (1005M) Inductor)
pins: 1, 2

## FHW0402UC030JST
designator L?  Inductance: 30nH
Inductor, 30nH, ±5%, 500mΩ, 400mA, SMD 0402; Manufacturer: FH(Guangdong Fenghua Advanced Tech); Manufacturer Part Number: FHW0402UC030JST; Self-Resonant Frequency: 2.35GHz; Q Factor: 25@250MHz; Package Size: 0402; JLCPCB Basic Part: No; JLCPCB Part Number: C317963; Supplier 1: LCSC; Category: Inductors; Supplier Part Number 1: C317963; Tolerance: ±5%; Rated Current: 400mA; DC Resistance: 500mΩ; RoHS: Yes; ComponentLink1Description: Datasheet; ComponentLink1URL: https://wmsc.lcsc.com/wmsc/upload/file/pdf/v2/lcsc/2302231208_FH--Guangdong-Fenghua-Advanced-Tech-FHW0402UC030JST_C317963.pdf; ComponentLink2Description: JLCPCB Part URL; ComponentLink2URL: https://jlcpcb.com/partdetail/C317963; ComponentLink3Description: LCSC Part URL; ComponentLink3URL: https://lcsc.com/product-detail/Inductors-SMD_FH-Guangdong-Fenghua-Advanced-Tech-FH-Guangdong-Fenghua-Advanced-Tech-FHW0402UC030JST_C317963.html
footprint IND-0402 (0402 (1005M) Inductor)
pins: 1, 2

## FHW0402UC033JST
designator L?  Inductance: 33nH
Inductor, 33nH, ±5%, 650mΩ, 350mA, SMD 0402; Manufacturer: FH(Guangdong Fenghua Advanced Tech); Manufacturer Part Number: FHW0402UC033JST; Self-Resonant Frequency: 2.35GHz; Q Factor: 24@250MHz; Package Size: 0402; JLCPCB Basic Part: No; JLCPCB Part Number: C317964; Supplier 1: LCSC; Category: Inductors; Supplier Part Number 1: C317964; Tolerance: ±5%; Rated Current: 350mA; DC Resistance: 650mΩ; RoHS: Yes; ComponentLink1Description: Datasheet; ComponentLink1URL: https://wmsc.lcsc.com/wmsc/upload/file/pdf/v2/lcsc/2302231208_FH--Guangdong-Fenghua-Advanced-Tech-FHW0402UC033JST_C317964.pdf; ComponentLink2Description: JLCPCB Part URL; ComponentLink2URL: https://jlcpcb.com/partdetail/C317964; ComponentLink3Description: LCSC Part URL; ComponentLink3URL: https://lcsc.com/product-detail/Inductors-SMD_FH-Guangdong-Fenghua-Advanced-Tech-FH-Guangdong-Fenghua-Advanced-Tech-FHW0402UC033JST_C317964.html
footprint IND-0402 (0402 (1005M) Inductor)
pins: 1, 2

## FHW0402UC036JST
designator L?  Inductance: 36nH
Inductor, 36nH, ±5%, 600mΩ, 250mA, SMD 0402; Manufacturer: FH(Guangdong Fenghua Advanced Tech); Manufacturer Part Number: FHW0402UC036JST; Self-Resonant Frequency: 2.32GHz; Q Factor: 25@250MHz; Package Size: 0402; JLCPCB Basic Part: No; JLCPCB Part Number: C317965; Supplier 1: LCSC; Category: Inductors; Supplier Part Number 1: C317965; Tolerance: ±5%; Rated Current: 250mA; DC Resistance: 600mΩ; RoHS: Yes; ComponentLink1Description: Datasheet; ComponentLink1URL: https://wmsc.lcsc.com/wmsc/upload/file/pdf/v2/lcsc/2302231208_FH--Guangdong-Fenghua-Advanced-Tech-FHW0402UC036JST_C317965.pdf; ComponentLink2Description: JLCPCB Part URL; ComponentLink2URL: https://jlcpcb.com/partdetail/C317965; ComponentLink3Description: LCSC Part URL; ComponentLink3URL: https://lcsc.com/product-detail/Inductors-SMD_FH-Guangdong-Fenghua-Advanced-Tech-FH-Guangdong-Fenghua-Advanced-Tech-FHW0402UC036JST_C317965.html
footprint IND-0402 (0402 (1005M) Inductor)
pins: 1, 2

## FHW0402UC039JST
designator L?  Inductance: 39nH
Inductor, 39nH, ±5%, 750mΩ, 200mA, SMD 0402; Manufacturer: FH(Guangdong Fenghua Advanced Tech); Manufacturer Part Number: FHW0402UC039JST; Self-Resonant Frequency: 2.1GHz; Q Factor: 25@250MHz; Package Size: 0402; JLCPCB Basic Part: No; JLCPCB Part Number: C317966; Supplier 1: LCSC; Category: Inductors; Supplier Part Number 1: C317966; Tolerance: ±5%; Rated Current: 200mA; DC Resistance: 750mΩ; RoHS: Yes; ComponentLink1Description: Datasheet; ComponentLink1URL: https://wmsc.lcsc.com/wmsc/upload/file/pdf/v2/lcsc/2302231208_FH--Guangdong-Fenghua-Advanced-Tech-FHW0402UC039JST_C317966.pdf; ComponentLink2Description: JLCPCB Part URL; ComponentLink2URL: https://jlcpcb.com/partdetail/C317966; ComponentLink3Description: LCSC Part URL; ComponentLink3URL: https://lcsc.com/product-detail/Inductors-SMD_FH-Guangdong-Fenghua-Advanced-Tech-FH-Guangdong-Fenghua-Advanced-Tech-FHW0402UC039JST_C317966.html
footprint IND-0402 (0402 (1005M) Inductor)
pins: 1, 2

## FHW0402UC040JST
designator L?  Inductance: 40nH
Inductor, 40nH, ±5%, 600mΩ, 220mA, SMD 0402; Manufacturer: FH(Guangdong Fenghua Advanced Tech); Manufacturer Part Number: FHW0402UC040JST; Self-Resonant Frequency: 2.24GHz; Q Factor: 25@250MHz; Package Size: 0402; JLCPCB Basic Part: No; JLCPCB Part Number: C317967; Supplier 1: LCSC; Category: Inductors; Supplier Part Number 1: C317967; Tolerance: ±5%; Rated Current: 220mA; DC Resistance: 600mΩ; RoHS: Yes; ComponentLink1Description: Datasheet; ComponentLink1URL: https://wmsc.lcsc.com/wmsc/upload/file/pdf/v2/lcsc/2302231208_FH--Guangdong-Fenghua-Advanced-Tech-FHW0402UC040JST_C317967.pdf; ComponentLink2Description: JLCPCB Part URL; ComponentLink2URL: https://jlcpcb.com/partdetail/C317967; ComponentLink3Description: LCSC Part URL; ComponentLink3URL: https://lcsc.com/product-detail/Inductors-SMD_FH-Guangdong-Fenghua-Advanced-Tech-FH-Guangdong-Fenghua-Advanced-Tech-FHW0402UC040JST_C317967.html
footprint IND-0402 (0402 (1005M) Inductor)
pins: 1, 2

## FHW0402UC043JST
designator L?  Inductance: 43nH
Inductor, 43nH, ±5%, 810mΩ, 100mA, SMD 0402; Manufacturer: FH(Guangdong Fenghua Advanced Tech); Manufacturer Part Number: FHW0402UC043JST; Self-Resonant Frequency: 2.03GHz; Q Factor: 25@250MHz; Package Size: 0402; JLCPCB Basic Part: No; JLCPCB Part Number: C317968; Supplier 1: LCSC; Category: Inductors; Supplier Part Number 1: C317968; Tolerance: ±5%; Rated Current: 100mA; DC Resistance: 810mΩ; RoHS: Yes; ComponentLink1Description: Datasheet; ComponentLink1URL: https://wmsc.lcsc.com/wmsc/upload/file/pdf/v2/lcsc/2302231208_FH--Guangdong-Fenghua-Advanced-Tech-FHW0402UC043JST_C317968.pdf; ComponentLink2Description: JLCPCB Part URL; ComponentLink2URL: https://jlcpcb.com/partdetail/C317968; ComponentLink3Description: LCSC Part URL; ComponentLink3URL: https://lcsc.com/product-detail/Inductors-SMD_FH-Guangdong-Fenghua-Advanced-Tech-FH-Guangdong-Fenghua-Advanced-Tech-FHW0402UC043JST_C317968.html
footprint IND-0402 (0402 (1005M) Inductor)
pins: 1, 2

## FHW0402UC047JST
designator L?  Inductance: 47nH
Inductor, 47nH, ±5%, 830mΩ, 150mA, SMD 0402; Manufacturer: FH(Guangdong Fenghua Advanced Tech); Manufacturer Part Number: FHW0402UC047JST; Self-Resonant Frequency: 2.1GHz; Q Factor: 25@250MHz; Package Size: 0402; JLCPCB Basic Part: No; JLCPCB Part Number: C317969; Supplier 1: LCSC; Category: Inductors; Supplier Part Number 1: C317969; Tolerance: ±5%; Rated Current: 150mA; DC Resistance: 830mΩ; RoHS: Yes; ComponentLink1Description: Datasheet; ComponentLink1URL: https://wmsc.lcsc.com/wmsc/upload/file/pdf/v2/lcsc/2302231208_FH--Guangdong-Fenghua-Advanced-Tech-FHW0402UC047JST_C317969.pdf; ComponentLink2Description: JLCPCB Part URL; ComponentLink2URL: https://jlcpcb.com/partdetail/C317969; ComponentLink3Description: LCSC Part URL; ComponentLink3URL: https://lcsc.com/product-detail/Inductors-SMD_FH-Guangdong-Fenghua-Advanced-Tech-FH-Guangdong-Fenghua-Advanced-Tech-FHW0402UC047JST_C317969.html
footprint IND-0402 (0402 (1005M) Inductor)
pins: 1, 2